# Altium footprint library 2.52-直插元件.PcbLib: 467 footprints (part 4 of 30)
Each footprint in its own frame and in the unit in brackets; x right, y up, seen from the top. Pads: shape width x height; smd on the part's side, far side on the other; paste and mask are expansions set on the pad; w line width, h text height; cw(c..) or ccw(c..) is an arc to the next point about the centre after c.
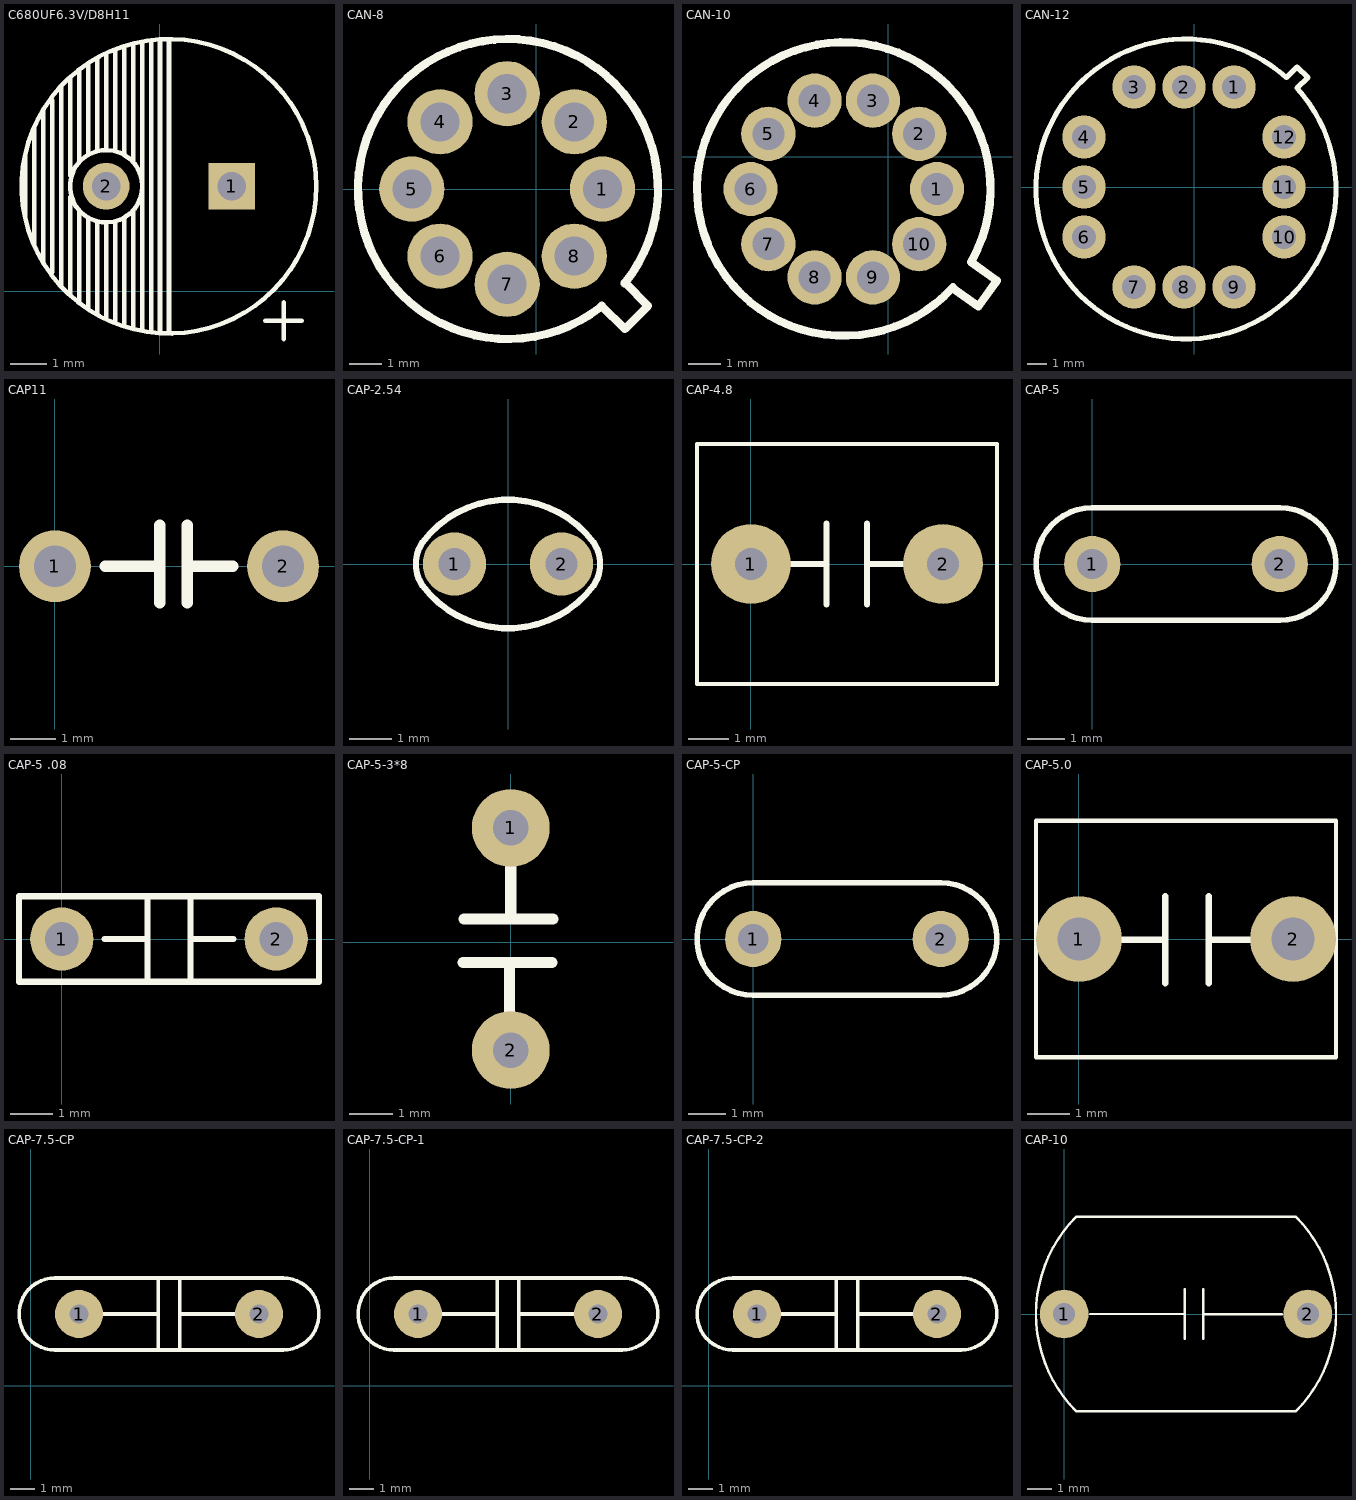
[diagram p3: the footprints below, top view; thin cyan lines are the x and y axes]

## C680UF6.3V/D8H11 [mm]
pads (2):
  rect 1.3x1.3 / inner round 1.3 / far side rect 1.3x1.3 hole 0.8: 1(2.004,2.921)
  round 1.3 hole 0.8: 2(-1.496,2.921)
Top Overlay:
  circle w0.127: c-1.496,2.921 r1.008
  circle w0.127: c0.254,2.921 r4.1
  lines w0.127: -3.746,2.121 -3.746,3.721 ; -3.496,1.321 -3.496,4.521 ; -3.246,0.821 -3.246,5.021 ; -2.996,0.521 -2.996,5.321 ; -2.746,0.171 -2.746,5.671 ; -2.496,-0.079 -2.496,2.621 ; -2.496,3.221 -2.496,5.921 ; -2.246,-0.279 -2.246,2.221 ; -2.246,3.621 -2.246,6.121 ; -1.996,-0.479 -1.996,2.021 ; -1.996,3.821 -1.996,6.321 ; -1.746,-0.629 -1.746,1.921 ; -1.746,3.921 -1.746,6.471 ; -1.496,-0.729 -1.496,1.871 ; -1.496,3.971 -1.496,6.571 ; -1.246,-0.859 -1.246,1.921 ; -1.246,3.921 -1.246,6.701 ; -0.996,-0.929 -0.996,2.021 ; -0.996,3.821 -0.996,6.771 ; -0.746,-1.029 -0.746,2.221 ; -0.746,3.621 -0.746,6.871 ; -0.496,-1.079 -0.496,6.921 ; -0.246,-1.109 -0.246,6.951 ; 0.004,-1.129 0.004,6.971 ; 0.254,-1.159 0.254,7.001 ; 2.936,-0.824 3.952,-0.824 ; 3.444,-1.332 3.444,-0.316

## CAN-8 [mm] "淘宝ID:黄晶宝石"
pads (8):
  round 2 hole 1.2: 1(2.032,0) 2(1.168,2.057) 3(-0.889,2.921) 4(-2.946,2.057) 5(-3.81,0) 6(-2.946,-2.057) 7(-0.889,-2.921) 8(1.168,-2.057)
Top Overlay:
  lines w0.254: 1.967,-3.623 cw(c-0.864,0) 2.709,-2.893 ; 2.007,-3.581 2.718,-4.293 3.429,-3.581 2.718,-2.87

## CAN-10 [mm] "淘宝ID:黄晶宝石"
pads (10):
  round 1.7 hole 1: 1(1.524,-1.016) 2(0.965,0.711) 3(-0.483,1.753) 4(-2.311,1.753) 5(-3.759,0.711) 6(-4.318,-1.016) 7(-3.759,-2.743) 8(-2.311,-3.785) 9(-0.483,-3.785) 10(0.965,-2.743)
Top Overlay:
  lines w0.254: 2.007,-4.115 2.819,-4.699 3.404,-3.886 2.591,-3.302 ; 2.02,-4.092 cw(c-1.397,-1.016) 2.624,-3.245

## CAN-12 [mm] "淘宝ID:黄晶宝石"
pads (12):
  round 2.2 hole 1.2: 1(2.032,5.08) 2(-0.508,5.08) 3(-3.048,5.08) 4(-5.588,2.54) 5(-5.588,0) 6(-5.588,-2.54) 7(-3.048,-5.08) 8(-0.508,-5.08) 9(2.032,-5.08) 10(4.572,-2.54) 11(4.572,0) 12(4.572,2.54)
Top Overlay:
  lines w0.254: 4.692,5.561 ccw(c-0.406,-0.102) 5.256,4.997 ; 4.699,5.563 5.232,6.096 5.791,5.563 5.232,5.029

## CAP11 [mil]
pads (2):
  round 62 hole 36: 1(0,0) 2(196.85,0)
Top Overlay:
  lines w10: 43.31,0 90.55,0 ; 90.55,-31.5 90.55,35.43 ; 114.17,-31.5 114.17,35.43 ; 114.17,0 153.54,0

## CAP-2.54 [mm]
pads (2):
  round 1.5 hole 0.762: 1(-1.27,0) 2(1.27,0)
Top Overlay:
  lines w0.15: -2.032,-0.508 ccw(c0,1.016) 2.032,-0.508 ; -2.032,0.508 cw(c0,-1.016) 2.032,0.508 ; -2.031,-0.507 cw(c-1.27,0) -2.031,0.507 ; 2.031,-0.507 ccw(c1.27,0) 2.031,0.507
3D body "Cap_100n.step": height 5.92, standoff -2, extent -2.919,-0.848 2.919,0.848

## CAP-4.8 [mm]
pads (2):
  round 2 hole 0.8: 1(0,0) 2(4.8,0)
Top Overlay:
  lines w0.1: -1.35,-3 -1.35,3 6.15,3 6.15,-3 -1.35,-3
  lines w0.15: 0.869,0 1.885,0 ; 1.885,-1.016 1.885,1.016 ; 2.901,-1.016 2.901,1.016 ; 2.901,0 3.917,0
3D body "User Library-folienkondi - wima mks 2.step": height 11.5, standoff -3, extent -1.2,-2.7 6,2.7

## CAP-5 [mm]
pads (2):
  round 1.5 hole 0.8: 1(0,0) 2(5,0)
Top Overlay:
  lines w0.15: 0,-1.5 cw(c0,0) 0,1.5 5,1.5 cw(c5,0) 5,-1.5 0,-1.5
3D body "User Library-100n.step": height 7.6, standoff -4.6, extent -1.25,-1.25 6.25,1.25

## CAP-5 .08 [mm]
pads (2):
  round 1.5 hole 0.8: 1(0,0) 2(5.08,0)
Top Overlay:
  lines w0.15: 1.016,0 2.032,0 ; 2.032,-1.016 2.032,1.016 ; 3.048,-1.016 3.048,1.016 ; 3.048,0 4.064,0 ; -1.016,-1.016 6.096,-1.016 6.096,1.016 -1.016,1.016 -1.016,-1.016
3D body "SW3dPS-CAPNP5.STEP": height 6.51, standoff -1.26, extent -1.27,-1.27 6.35,1.27

## CAP-5-3*8 [mil]
pads (2):
  round 70 hole 32: 1(0,103) 2(0,-97)
Top Overlay:
  lines w10: -43,-18 37,-18 ; -42,21 38,21 ; -1,-96 -1,-18 ; 0,21 0,103
3D body "User Library-Capacitor no pol 0_2in pitch.STEP": height 285, standoff -93.74, extent -60,-104 65,116

## CAP-5-CP [mm]
pads (2):
  round 1.5 hole 0.8: 1(0,0) 2(5,0)
Top Overlay:
  lines w0.15: 0,-1.5 cw(c0,0) 0,1.5 5,1.5 cw(c5,0) 5,-1.5 0,-1.5
3D body "User Library-Kondensator_5mm.step": height 10.5, standoff -2.07, extent -1.5,-1.255 6.5,1.255

## CAP-5.0 [mm]
pads (2):
  round 2 hole 1: 1(0,0) 2(5,0)
Top Overlay:
  lines w0.1: 6,-2.76 -1,-2.76 -1,2.76 6,2.76 ; 6,-2.75 6,2.75
  lines w0.15: 1,-0.021 2.016,-0.021 ; 2.016,-1.037 2.016,0.995 ; 3.032,-1.037 3.032,0.995 ; 3.032,-0.021 4.048,-0.021
3D body "User Library-CAPACITOR_5mm.step": height 11, standoff -4, extent -1,-2.76 6,2.76

## CAP-7.5-CP [mm]
pads (2):
  round 2 hole 0.8: 1(2,3) 2(9.5,3)
Top Overlay:
  lines w0.15: 2,3 5.3,3 ; 5.3,1.5 5.3,4.5 ; 6.2,1.5 6.2,4.5 ; 6.2,3 9.5,3 ; 1,1.5 cw(c1,3) 1,4.5 10.5,4.5 cw(c10.5,3) 10.5,1.5 1,1.5
3D body "User Library-final MOV7,5.step": height 16.5, standoff -2, extent 0.049,1.587 11.451,4.413

## CAP-7.5-CP-1 [mm]
pads (2):
  round 2 hole 0.8: 1(2,3) 2(9.5,3)
Top Overlay:
  lines w0.15: 2,3 5.3,3 ; 5.3,1.5 5.3,4.5 ; 6.2,1.5 6.2,4.5 ; 6.2,3 9.5,3 ; 1,1.5 cw(c1,3) 1,4.5 10.5,4.5 cw(c10.5,3) 10.5,1.5 1,1.5
3D body "ECK-A3D102KBP.step": height 9.03, standoff -4.16, extent 1.749,1.804 9.75,4.196

## CAP-7.5-CP-2 [mm] "淘宝ID:黄晶宝石   店铺网址:https://shop463601444.taobao.com"
pads (2):
  round 2 hole 0.8: 1(2,3) 2(9.5,3)
Top Overlay:
  lines w0.15: 2,3 5.3,3 ; 5.3,1.5 5.3,4.5 ; 6.2,1.5 6.2,4.5 ; 6.2,3 9.5,3 ; 1,1.5 cw(c1,3) 1,4.5 10.5,4.5 cw(c10.5,3) 10.5,1.5 1,1.5
3D body "User Library-DEBB33A472KA3B.STEP": height 16, standoff -4, extent -0.25,1.01 11.75,4.99

## CAP-10 [mm]
pads (2):
  round 2 hole 0.9: 1(0,0) 2(10,0)
Top Overlay:
  lines w0.1: 1.072,0 4.953,0.003 ; 4.953,-1.016 4.953,1.016 ; 5.715,-1.016 5.715,1.016 ; 5.715,-0.007 8.939,-0.007 ; 0.5,-4 cw(c4.5,0) 0.5,4 9.5,4 cw(c5.5,0) 9.5,-4 0.5,-4
3D body "User Library-RAD CAP 12_5MM.STEP": height 15.97, standoff -4.44, extent -1.25,-2.95 11.25,2.95